# Altium footprint library ThanhNT.PcbLib: 579 footprints (part 3 of 37)
Each footprint in its own frame and in the unit in brackets; x right, y up, seen from the top. Pads: shape width x height; smd on the part's side, far side on the other; paste and mask are expansions set on the pad; w line width, h text height; cw(c..) or ccw(c..) is an arc to the next point about the centre after c.
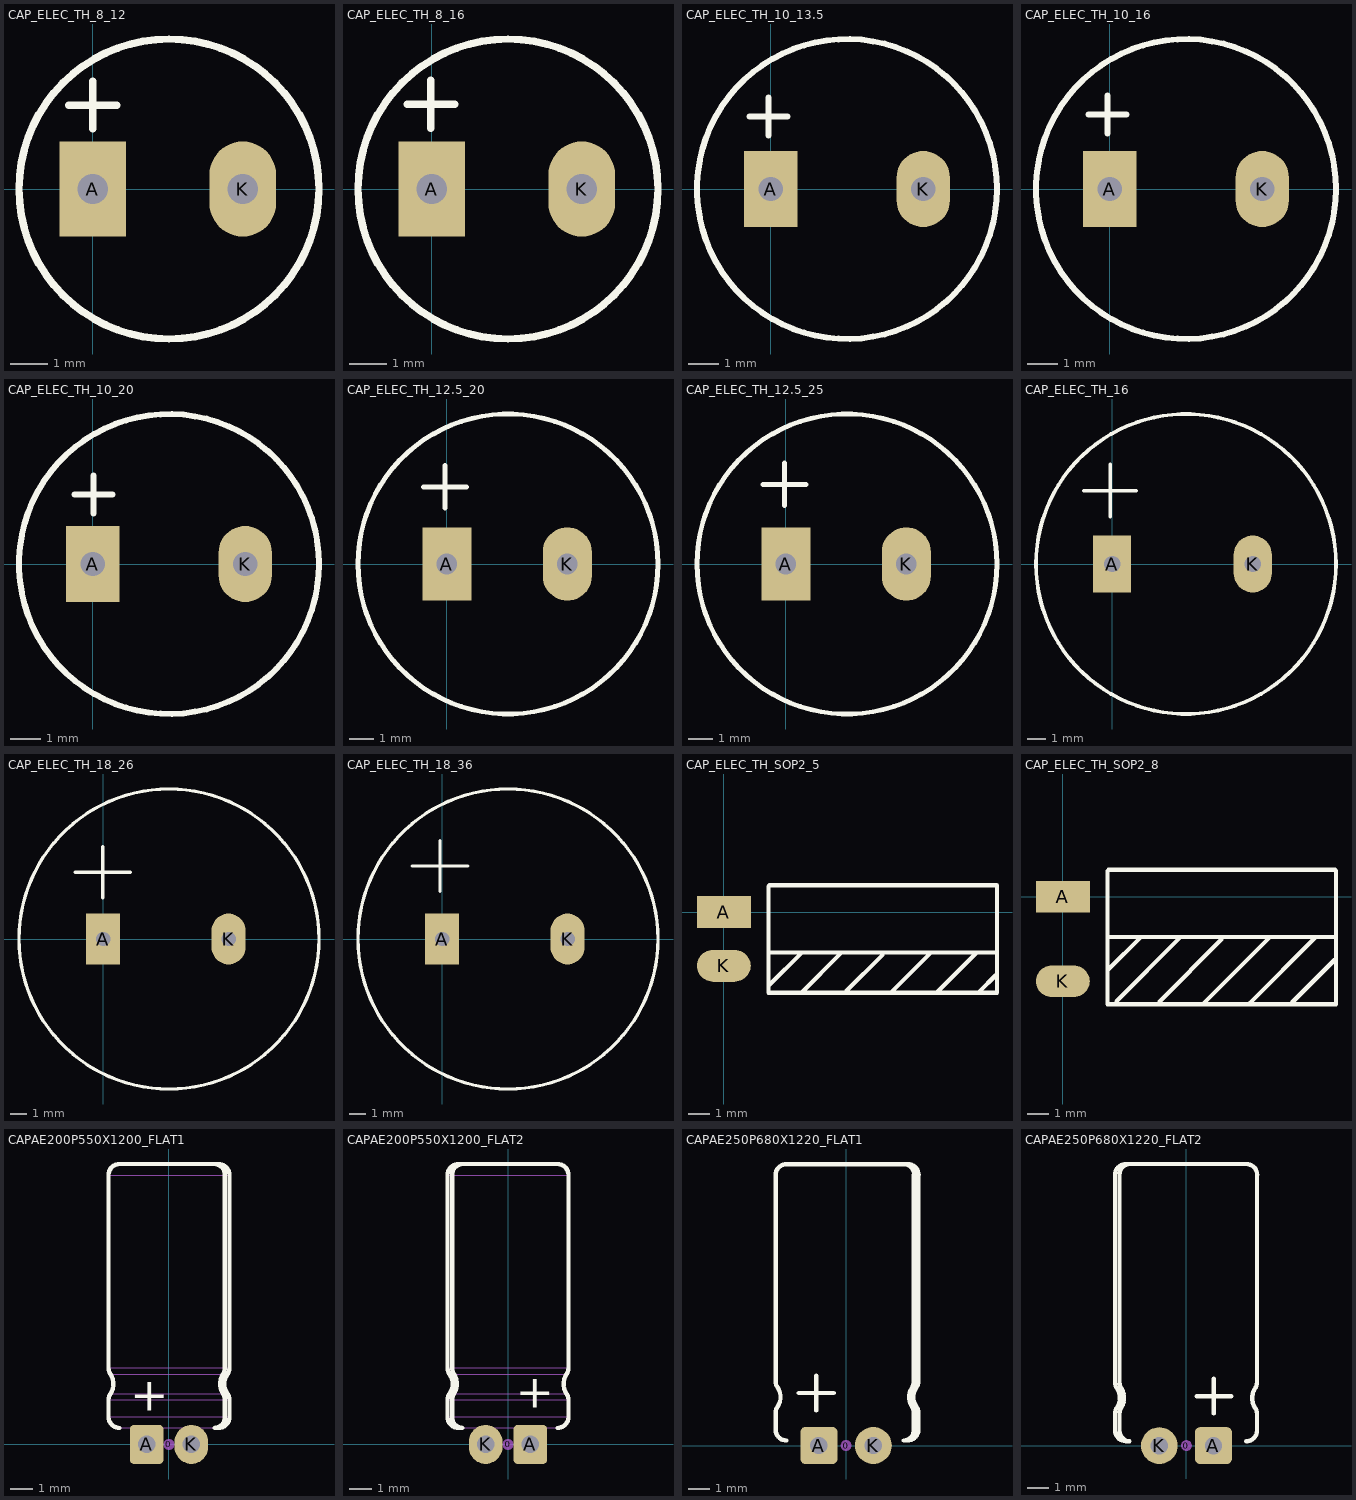
[diagram p2: the footprints below, top view; thin cyan lines are the x and y axes]

## CAP_ELEC_TH_8_12 [mil] "Radial Capacitor (Code E: 8mm)"
pads (2):
  rect 70x100 hole 32: A(0,0)
  oval 70x100 hole 32: K(157.48,0)
Top Overlay:
  circle w7.87: c80,0 r157.48
  lines w7.87: -25,88 25,88 ; 0,63 0,113
3D body "User Library-Cap-EL(8x12-3_5)T.STEP": height 484.33, standoff -129.92, extent -79.48,-157.47 235.56,157.48

## CAP_ELEC_TH_8_16 [mil] "Radial Capacitor (Code E: 8mm)"
pads (2):
  rect 70x100 hole 32: A(0,0)
  oval 70x100 hole 32: K(157.48,0)
Top Overlay:
  circle w7.87: c80,0 r157.48
  lines w7.87: -26,89 24,89 ; -1,64 -1,114
3D body "User Library-Cap-EL(8x16-3_5).STEP": height 630, standoff -129.92, extent -79.48,-157.46 235.56,157.47

## CAP_ELEC_TH_10_13.5 [mil] "Radial Capacitor (Code F: 10mm)"
pads (2):
  rect 70x100 hole 32: A(0,0)
  oval 70x100 hole 32: K(200,0)
Top Overlay:
  circle w7.87: c100,0 r196.85
  lines w7.87: -28,95 22,95 ; -3,70 -3,120
3D body "User Library-Cap-EL(10x13_5-5)T.STEP": height 551.26, standoff -137.8, extent -96.85,-196.84 296.93,196.85

## CAP_ELEC_TH_10_16 [mil] "Radial Capacitor (Code F: 10mm)"
pads (2):
  rect 70x100 hole 32: A(0,0)
  oval 70x100 hole 32: K(200,0)
Top Overlay:
  circle w7.87: c100,0 r196.85
  lines w7.87: -28,98 22,98 ; -3,73 -3,123
3D body "User Library-Cap-EL(10x16-5).STEP": height 630, standoff -129.92, extent -97.85,-196.84 295.93,196.84

## CAP_ELEC_TH_10_20 [mil] "Radial Capacitor (Code F: 10mm)"
pads (2):
  rect 70x100 hole 32: A(0,0)
  oval 70x100 hole 32: K(200,0)
Top Overlay:
  circle w7.87: c100,0 r196.85
  lines w7.87: -24,91 26,91 ; 1,66 1,116
3D body "User Library-Cap-EL(10x20-5).STEP": height 787.48, standoff -129.92, extent -95.85,-197.85 297.93,195.85

## CAP_ELEC_TH_12.5_20 [mil] "CAP Radial 12.5mm"
pads (2):
  rect 80x120 hole 34: A(0,0)
  oval 80x120 hole 34: K(196.85,0)
Top Overlay:
  circle w7.87: c100,0 r245
  lines w7.87: -38,126 32,126 ; -3,91 -3,161
3D body "User Library-Cap-EL(12_5x20-5)T.STEP": height 807.17, standoff -137.8, extent -147.06,-245.05 345.14,247.06

## CAP_ELEC_TH_12.5_25 [mil] "CAP Radial 12.5mm"
pads (2):
  rect 80x120 hole 34: A(0,0)
  oval 80x120 hole 34: K(196.85,0)
Top Overlay:
  circle w7.87: c100,0 r245
  lines w7.87: -37,130 33,130 ; -2,95 -2,165
3D body "User Library-Cap-EL(12_5x25-5)T.STEP": height 1004.02, standoff -137.8, extent -145.06,-247.05 347.15,245.05

## CAP_ELEC_TH_16 [mil] "CAP Radial 16mm"
pads (2):
  rect 80x120 hole 34: A(0,0)
  oval 80x120 hole 34: K(295.28,0)
Top Overlay:
  circle w7.87: c155,0 r315.04
  lines w7.87: -60,154 50,154 ; -4,99 -4,209
3D body "User Library-Cap-EL(16x26-7_5).STEP": height 1023.66, standoff -169.29, extent -165.96,-314.83 464.04,314.84

## CAP_ELEC_TH_18_26 [mil] "CAP Radial 18mm"
pads (2):
  rect 80x120 hole 34: A(0,0)
  oval 80x120 hole 34: K(295.28,0)
Top Overlay:
  circle w7.87: c155,0 r353.06
  lines w7.87: -66,157 64,157 ; -1,97 -1,217
3D body "User Library-Cap-EL(18x26-7_5)T.STEP": height 1063.11, standoff -118.11, extent -206.33,-354.29 502.41,354.3

## CAP_ELEC_TH_18_36 [mil] "CAP Radial 18mm"
pads (2):
  rect 80x120 hole 34: A(0,0)
  oval 80x120 hole 34: K(295.28,0)
Top Overlay:
  circle w7.87: c155,0 r353.06
  lines w7.87: -70,172 60,172 ; -5,112 -5,232
3D body "User Library-Cap-EL(18x36-7_5)T.STEP": height 1456.77, standoff -118.11, extent -205.32,-354.32 503.41,354.33

## CAP_ELEC_TH_SOP2_5 [mm] "C10uF"
pads (2):
  rect 2.54x1.5 smd: A(0,0)
  oval 2.54x1.5 smd: K(0,-2.54)
Top Overlay:
  lines w0.2: 2.105,1.216 2.105,-3.81 12.895,-3.81 12.895,1.253 12.878,1.27 2.159,1.27 ; 2.159,-3.429 3.683,-1.905 ; 2.159,-1.905 12.878,-1.905 12.827,-1.905 ; 3.708,-3.759 5.486,-1.981 ; 5.766,-3.734 7.48,-2.019 ; 7.938,-3.746 9.779,-1.905 ; 10.058,-3.785 11.9,-1.943 ; 12.065,-3.751 12.836,-2.98

## CAP_ELEC_TH_SOP2_8 [mm] "C100uF"
pads (2):
  rect 2.54x1.5 smd: A(0,0)
  oval 2.54x1.5 smd: K(0,-4)
Top Overlay:
  lines w0.2: 2.105,1.216 2.105,-5.08 12.895,-5.08 12.895,1.227 ; 2.159,-3.429 3.683,-1.905 ; 2.159,-1.905 12.852,-1.905 ; 2.159,1.27 12.852,1.27 ; 2.527,-4.94 5.486,-1.981 ; 4.572,-4.953 7.48,-2.019 ; 6.667,-5.016 9.779,-1.905 ; 8.826,-5.016 11.9,-1.943 ; 10.829,-4.987 12.836,-2.98

## CAPAE200P550X1200_FLAT1 [mil]
height 216.54
pads (3):
  round 20 on Mech15: 0(0,0)
  rrect25% 60x70 hole 31.5: A(-40,0)
  oval 60x70 hole 31.5: K(40,0)
Top Overlay:
  lines w7.87: -88.58,29.53 cw(c-88.58,49.25) -108.31,49.25 -108.31,79.64 cw(c-88.58,79.64) -104.79,90.88 ccw(c-129.92,108.31) -104.79,125.74 cw(c-88.58,136.98) -108.31,136.98 -108.31,482.32 cw(c-88.58,482.32) -88.58,502.05 81.84,502.05 cw(c81.06,483.05) 100.06,482.32 100.06,136.98 cw(c79.2,136.92) 96.81,125.74 ccw(c124.34,108.31) 96.81,90.88 cw(c79.2,79.7) 100.06,79.64 100.06,49.25 cw(c81.06,48.53) 81.84,29.53 ; 82.99,29.57 88.58,29.57 ccw(c88.58,49.25) 108.27,49.25 108.27,79.64 ccw(c88.58,79.64) 104.76,90.86 cw(c129.92,108.31) 104.76,125.76 ccw(c88.58,136.98) 108.27,136.98 108.27,482.32 ccw(c88.58,482.32) 88.58,502.01 82.99,502.01
  text "+" at -69,60 h60
Mechanical 13:
  lines w1.97: -49.21,19.68 -29.53,19.68 ; -49.21,29.53 -49.21,0 ccw(c-39.37,0) -29.53,0 -29.53,29.53 ; 29.53,19.68 49.21,19.68 ; 29.53,29.53 29.53,0 ccw(c39.37,0) 49.21,0 49.21,29.53 ; 82.99,29.57 88.58,29.57 ccw(c88.58,49.25) 108.27,49.25 ; 82.99,502.01 88.58,502.01 cw(c88.58,482.32) 108.27,482.32 ; -108.31,49.25 ccw(c-88.58,49.25) -88.58,29.53 81.84,29.53 ccw(c81.06,48.53) 100.06,49.25 100.06,79.64 ccw(c79.2,79.7) 96.81,90.88 ; -108.31,49.25 108.27,49.25 ; -108.31,49.25 -108.31,79.64 ; -108.31,79.64 cw(c-88.58,79.64) -104.79,90.88 ; -108.31,79.64 108.27,79.64 ; -108.31,136.98 ccw(c-88.58,136.98) -104.79,125.74 ; -108.31,136.98 108.27,136.98 ; -108.31,136.98 -108.31,482.32 ; -108.31,482.32 cw(c-88.58,482.32) -88.58,502.05 81.84,502.05 cw(c81.06,483.05) 100.06,482.32 100.06,136.98 cw(c79.2,136.92) 96.81,125.74 ; -108.31,482.32 108.27,482.32 ; -104.79,90.88 ccw(c-129.92,108.31) -104.79,125.74 ; -104.79,90.88 96.81,90.88 ; -104.79,125.74 96.81,125.74 ; 96.81,90.88 cw(c124.34,108.31) 96.81,125.74 ; 96.81,90.88 104.76,90.86 ; 96.81,125.74 104.76,125.76 ; 104.76,90.86 cw(c129.92,108.31) 104.76,125.76 ; 104.76,90.86 cw(c88.58,79.64) 108.27,79.64 ; 104.76,125.76 ccw(c88.58,136.98) 108.27,136.98 ; 108.27,49.25 108.27,79.64 ; 108.27,136.98 108.27,482.32
3D body "CAPAE200P550X1200_FLAT1.STEP": height 215.69, standoff -70, extent -107.37,-9.82 107.35,502.05

## CAPAE200P550X1200_FLAT2 [mil]
height 216.54
pads (3):
  round 20 on Mech15: 0(0,0)
  rrect25% 60x70 hole 31.5: A(40,0)
  oval 60x70 hole 31.5: K(-40,0)
Top Overlay:
  lines w7.87: -82.99,29.57 -88.58,29.57 cw(c-88.58,49.25) -108.27,49.25 -108.27,79.64 cw(c-88.58,79.64) -104.76,90.86 ccw(c-129.92,108.31) -104.76,125.76 cw(c-88.58,136.98) -108.27,136.98 -108.27,482.32 cw(c-88.58,482.32) -88.58,502.01 -82.99,502.01 ; -81.84,29.53 cw(c-81.06,48.53) -100.06,49.25 -100.06,79.64 cw(c-79.2,79.7) -96.81,90.88 ccw(c-124.34,108.31) -96.81,125.74 cw(c-79.2,136.92) -100.06,136.98 -100.06,482.32 cw(c-81.06,483.05) -81.84,502.05 88.58,502.05 cw(c88.58,482.32) 108.31,482.32 108.31,136.98 cw(c88.58,136.98) 104.79,125.74 ccw(c129.92,108.31) 104.79,90.88 cw(c88.58,79.64) 108.31,79.64 108.31,49.25 cw(c88.58,49.25) 88.58,29.53
  text "+" at 14,66 h60
Mechanical 13:
  lines w1.97: -82.99,29.57 -88.58,29.57 cw(c-88.58,49.25) -108.27,49.25 ; -82.99,502.01 -88.58,502.01 ccw(c-88.58,482.32) -108.27,482.32 ; -49.21,19.68 -29.53,19.68 ; -49.21,29.53 -49.21,0 ccw(c-39.37,0) -29.53,0 -29.53,29.53 ; 29.53,19.68 49.21,19.68 ; 29.53,29.53 29.53,0 ccw(c39.37,0) 49.21,0 49.21,29.53 ; -108.27,49.25 -108.27,79.64 ; -108.27,49.25 108.31,49.25 ; -108.27,79.64 cw(c-88.58,79.64) -104.76,90.86 ; -108.27,79.64 108.31,79.64 ; -108.27,136.98 ccw(c-88.58,136.98) -104.76,125.76 ; -108.27,136.98 -108.27,482.32 ; -108.27,136.98 108.31,136.98 ; -108.27,482.32 108.31,482.32 ; -104.76,90.86 ccw(c-129.92,108.31) -104.76,125.76 ; -104.76,90.86 -96.81,90.88 ; -104.76,125.76 -96.81,125.74 ; -96.81,90.88 ccw(c-79.2,79.7) -100.06,79.64 -100.06,49.25 ccw(c-81.06,48.53) -81.84,29.53 88.58,29.53 ccw(c88.58,49.25) 108.31,49.25 ; -96.81,90.88 ccw(c-124.34,108.31) -96.81,125.74 ; -96.81,90.88 104.79,90.88 ; -96.81,125.74 cw(c-79.2,136.92) -100.06,136.98 -100.06,482.32 cw(c-81.06,483.05) -81.84,502.05 88.58,502.05 cw(c88.58,482.32) 108.31,482.32 ; -96.81,125.74 104.79,125.74 ; 104.79,90.88 cw(c88.58,79.64) 108.31,79.64 ; 104.79,90.88 cw(c129.92,108.31) 104.79,125.74 ; 104.79,125.74 ccw(c88.58,136.98) 108.31,136.98 ; 108.31,49.25 108.31,79.64 ; 108.31,136.98 108.31,482.32
3D body "CAPAE200P550X1200_FLAT2.STEP": height 215.69, standoff -70, extent -107.33,-9.82 107.39,502.05

## CAPAE250P680X1220_FLAT1 [mm]
height 6.8
pads (3):
  round 0.508 on Mech15: 0(0,0)
  rrect25% 1.7x1.7 hole 0.8: A(-1.25,0)
  round 1.7 hole 0.8: K(1.25,0)
Top Overlay:
  lines w0.2: -2.743,0.229 cw(c-2.743,0.73) -3.244,0.73 -3.244,1.501 cw(c-2.743,1.501) -3.155,1.787 ccw(c-3.793,2.23) -3.155,2.672 cw(c-2.743,2.958) -3.244,2.958 -3.244,12.441 cw(c-2.743,12.441) -2.743,12.942 2.661,12.942 ; -2.173,2.413 -0.573,2.413 ; -1.373,1.613 -1.373,3.213 ; 2.652,0.229 ccw(c2.632,0.711) 3.115,0.73 3.115,1.501 ccw(c2.585,1.503) 3.033,1.787 cw(c3.732,2.23) 3.033,2.672 ccw(c2.585,2.956) 3.115,2.958 3.115,12.446 ; 2.661,12.947 cw(c2.641,12.464) 3.124,12.446 ; 2.682,0.23 2.824,0.23 ccw(c2.824,0.73) 3.324,0.73 3.324,1.501 ccw(c2.824,1.501) 3.234,1.786 cw(c3.874,2.23) 3.234,2.673 ccw(c2.824,2.958) 3.324,2.958 3.324,12.446 ; 2.691,12.946 2.833,12.946 cw(c2.833,12.446) 3.333,12.446
3D body "CAPAE250P680X1220_FLAT1.STEP": height 6.77, standoff -1.78, extent -3.372,-0.249 3.371,12.952

## CAPAE250P680X1220_FLAT2 [mm]
height 6.8
pads (3):
  round 0.508 on Mech15: 0(0,0)
  rrect25% 1.7x1.7 hole 0.8: A(1.25,0)
  round 1.7 hole 0.8: K(-1.25,0)
Top Overlay:
  lines w0.2: -2.656,0.204 -2.798,0.204 cw(c-2.798,0.704) -3.298,0.704 -3.298,1.476 cw(c-2.798,1.476) -3.209,1.761 ccw(c-3.848,2.204) -3.209,2.647 cw(c-2.798,2.932) -3.298,2.932 -3.298,12.517 cw(c-2.798,12.517) -2.798,13.017 -2.656,13.017 ; -2.627,0.203 cw(c-2.607,0.686) -3.09,0.704 -3.09,1.476 cw(c-2.56,1.477) -3.007,1.761 ccw(c-3.706,2.204) -3.007,2.647 cw(c-2.56,2.931) -3.09,2.932 -3.09,12.517 cw(c-2.607,12.535) -2.627,13.018 2.774,13.018 cw(c2.774,12.522) 3.27,12.522 ; 0.472,2.286 2.072,2.286 ; 1.272,1.486 1.272,3.086 ; 2.763,0.198 ccw(c2.763,0.699) 3.264,0.699 3.264,1.471 ccw(c2.763,1.471) 3.175,1.756 cw(c3.813,2.199) 3.175,2.642 ccw(c2.763,2.927) 3.264,2.927 3.264,12.522
3D body "CAPAE250P680X1220_FLAT2.STEP": height 6.77, standoff -1.78, extent -3.371,-0.249 3.372,12.952